# Altium footprint library Libraries_2014_0618.PcbLib: 391 footprints (part 23 of 25)
Each footprint in its own frame and in the unit in brackets; x right, y up, seen from the top. Pads: shape width x height; smd on the part's side, far side on the other; paste and mask are expansions set on the pad; w line width, h text height; cw(c..) or ccw(c..) is an arc to the next point about the centre after c.
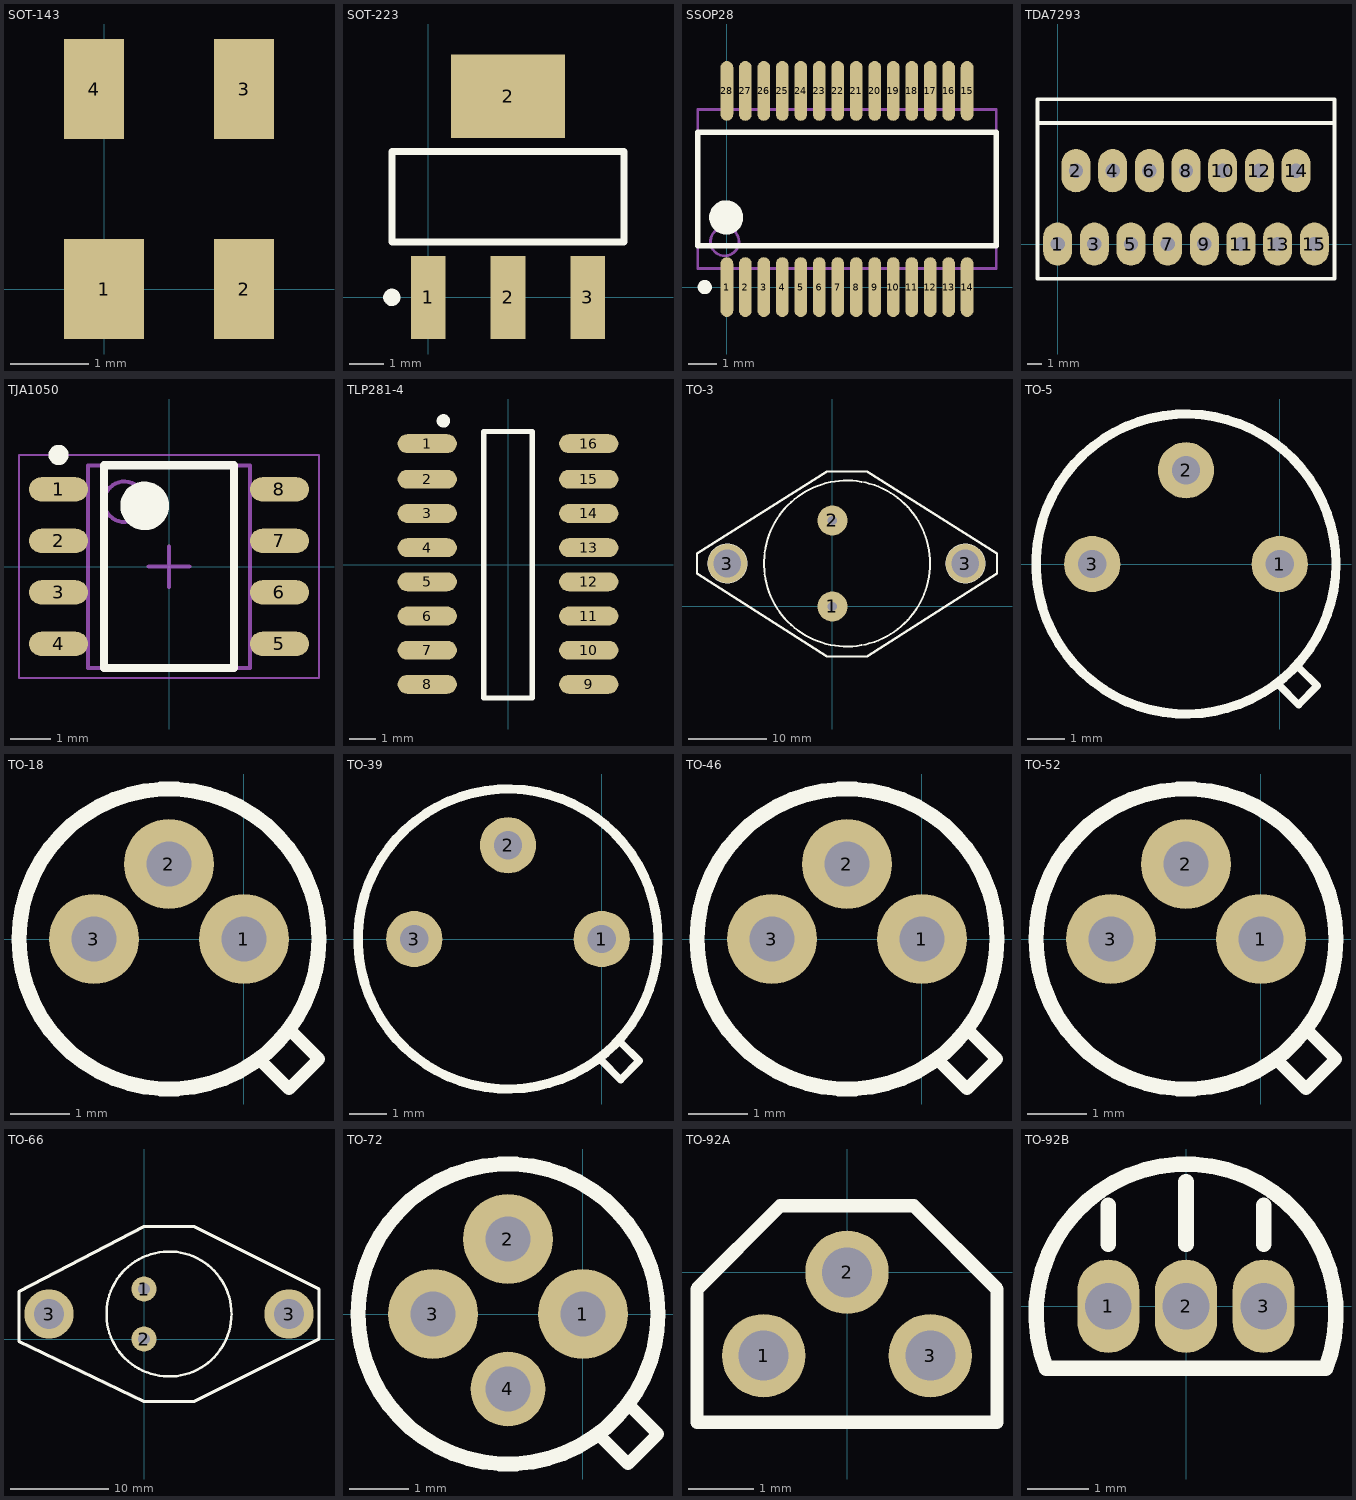
[diagram p22: the footprints below, top view; thin cyan lines are the x and y axes]

## SOT-143 [mil]
pads (4):
  rect 40x50 smd: 1(0,0)
  rect 30x50 smd: 2(70,0) 3(70,100) 4(-5,100)

## SOT-223 [mm] "SOT223, 4-Leads, Body 6.7x7.3mm (max), Pitch 2.30mm, IPC Medium Density"
height 1.8
pads (4):
  rect 1x2.4 smd: 1(0,0) 2(2.3,0) 3(4.6,0)
  rect 3.3x2.4 smd: 2(2.3,5.8)
Top Overlay:
  circle w0.25: c-1.05,0 r0.125
  lines w0.2: -1.05,1.6 5.65,1.6 5.65,4.2 -1.05,4.2 -1.05,1.6

## SSOP28 [mm] "SSOP, 28-Leads, 10.5x5.6mm (max), 0.65mm"
height 2
pads (28):
  oval 0.45x2.1 smd: 1(0,0) 2(0.65,0) 3(1.3,0) 4(1.95,0) 5(2.6,0) 6(3.25,0) 7(3.9,0) 8(4.55,0) 9(5.2,0) 10(5.85,0) 11(6.5,0) 12(7.15,0) 13(7.8,0) 14(8.45,0) 15(8.45,6.9) 16(7.8,6.9) 17(7.15,6.9) 18(6.5,6.9) 19(5.85,6.9) 20(5.2,6.9) 21(4.55,6.9) 22(3.9,6.9) 23(3.25,6.9) 24(2.6,6.9) 25(1.95,6.9) 26(1.3,6.9) 27(0.65,6.9) 28(0,6.9)
Top Overlay:
  circle w0.6: c-0.025,2.45 r0.3
  circle w0.25: c-0.775,0 r0.125
  lines w0.2: -1.025,1.45 -1.025,5.45 9.475,5.45 9.475,1.45 -1.025,1.45
Mechanical 13:
  circle w0.1: c-0.075,1.6 r0.5
  lines w0.1: -1.025,0.65 -1.025,6.25 9.475,6.25 9.475,0.65 -1.025,0.65

## TDA7293 [mm] "集成功放"
height 20
pads (15):
  oval 2x3 hole 1: 1(0,0) 2(1.27,5.08) 3(2.54,0) 4(3.81,5.08) 5(5.08,0) 6(6.35,5.08) 7(7.62,0) 8(8.89,5.08) 9(10.16,0) 10(11.43,5.08) 11(12.7,0) 12(13.97,5.08) 13(15.24,0) 14(16.51,5.08) 15(17.78,0)
Top Overlay:
  lines w0.254: -1.397,8.382 19.177,8.382 ; -1.397,-2.413 -1.397,10.033 19.177,10.033 19.177,-2.413 -1.397,-2.413

## TJA1050 [mm] "SOIC, 8-Leads, Body 4.90x3.90mm, Pitch 1.27mm, IPC Medium Density"
height 1.75
pads (8):
  oval 1.45x0.6 smd: 1(-2.725,1.905) 2(-2.725,0.635) 3(-2.725,-0.635) 4(-2.725,-1.905) 5(2.725,-1.905) 6(2.725,-0.635) 7(2.725,0.635) 8(2.725,1.905)
Top Overlay:
  circle w0.6: c-0.6,1.5 r0.3
  circle w0.25: c-2.725,2.755 r0.125
  lines w0.2: -1.6,-2.5 1.6,-2.5 1.6,2.5 -1.6,2.5 -1.6,-2.5
Mechanical 13:
  circle w0.1: c-1.1,1.6 r0.5
  lines w0.1: -2,-2.5 2,-2.5 2,2.5 -2,2.5 -2,-2.5
Mechanical 15:
  lines w0.05: -3.7,-2.75 3.7,-2.75 3.7,2.75 -3.7,2.75 -3.7,-2.75
  lines w0.1: -0.5,0 0.5,0 ; 0,-0.5 0,0.5
3D body: height 1.75, standoff 0.15, extent -2,-2.5 2,2.5

## TLP281-4 [mm]
height 1.55
pads (16):
  oval 2.2x0.7 smd: 1(-3,4.5) 2(-3,3.175) 3(-3,1.905) 4(-3,0.635) 5(-3,-0.635) 6(-3,-1.905) 7(-3,-3.175) 8(-3,-4.445) 9(3,-4.445) 10(3,-3.175) 11(3,-1.905) 12(3,-0.635) 13(3,0.635) 14(3,1.905) 15(3,3.175) 16(3,4.5)
Top Overlay:
  circle w0.25: c-2.4,5.345 r0.125
  lines w0.2: -0.9,-4.95 0.9,-4.95 0.9,4.95 -0.9,4.95 -0.9,-4.95

## TO-3 [mm]
pads (4):
  round 3.81 hole 1.2: 1(0,0) 2(0,10.922)
  round 5 hole 3.5: 3(-13.335,5.461) 3(16.891,5.461)
Top Overlay:
  circle w0.254: c1.854,5.461 r10.541
  circle w0.254: c16.891,5.461 r2.413
  circle w0.254: c-13.335,5.461 r2.413
  lines w0.305: -17.196,4.191 -0.686,-6.35 4.394,-6.35 20.904,4.191 20.904,6.731 4.394,17.145 -0.686,17.145 -17.196,6.731 -17.196,4.191

## TO-5 [mil]
pads (3):
  round 60 hole 30: 1(0,0) 2(-100,100) 3(-200,0)
Top Overlay:
  circle w10: c-100,0 r160
  lines w8: 0,-130 20,-150 40,-130 20,-110

## TO-18 [mil]
pads (3):
  round 60 hole 30: 1(0,0) 2(-50,50) 3(-100,0)
Top Overlay:
  circle w10: c-50,0 r100
  lines w8: 10,-80 30,-100 50,-80 30,-60

## TO-39 [mil]
pads (3):
  round 60 hole 30: 1(0,0) 2(-100,100) 3(-200,0)
Top Overlay:
  circle w10: c-100,0 r160
  lines w8: 0,-130 20,-150 40,-130 20,-110

## TO-46 [mil]
pads (3):
  round 60 hole 30: 1(0,0) 2(-50,50) 3(-100,0)
Top Overlay:
  circle w10: c-50,0 r100
  lines w8: 10,-80 30,-100 50,-80 30,-60

## TO-52 [mil]
pads (3):
  round 60 hole 30: 1(0,0) 2(-50,50) 3(-100,0)
Top Overlay:
  circle w10: c-50,0 r100
  lines w8: 10,-80 30,-100 50,-80 30,-60

## TO-66 [mm]
pads (4):
  round 2.54 hole 1.2: 1(0,5.08) 2(0,0)
  round 5 hole 3: 3(-9.652,2.54) 3(14.732,2.54)
Top Overlay:
  circle w0.254: c14.732,2.54 r2.032
  circle w0.254: c-9.652,2.54 r2.032
  circle w0.254: c2.54,2.54 r6.35
  lines w0.305: -12.7,-0.254 0,-6.35 5.08,-6.35 17.78,0 17.78,5.08 5.08,11.43 0,11.43 -12.7,4.826 -12.7,-0.254

## TO-72 [mil]
pads (4):
  round 60 hole 30: 1(0,0) 2(-50,50) 3(-100,0)
  round 50 hole 30: 4(-50,-50)
Top Overlay:
  circle w10: c-50,0 r100
  lines w8: 10,-80 30,-100 50,-80 30,-60

## TO-92A [mil]
pads (3):
  round 50 hole 30: 1(-50,-50) 2(0,0) 3(50,-50)
Top Overlay:
  lines w8: -90,-90 -90,-10 -40,40 40,40 90,-10 90,-90 -90,-90

## TO-92B [mil]
pads (3):
  oval 40x60 hole 30: 1(-50,0) 2(0,0) 3(50,0)
Top Overlay:
  lines w9.84: -90,-40 90,-40
  lines w10: -90,-40 cw(c0,-5) 90,-40 ; -50,40 -50,65 ; 0,40 0,80 ; 50,40 50,65